# Altium footprint library 常用元件封裝庫(pcb).PCBLIB: 386 footprints (part 25 of 25)
Each footprint in its own frame and in the unit in brackets; x right, y up, seen from the top. Pads: shape width x height; smd on the part's side, far side on the other; paste and mask are expansions set on the pad; w line width, h text height; cw(c..) or ccw(c..) is an arc to the next point about the centre after c.
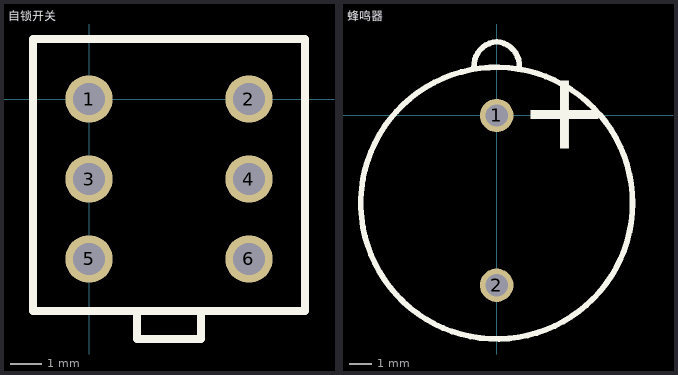
[diagram p24: the footprints below, top view; thin cyan lines are the x and y axes]

## 自锁开关 [mm]
pads (6):
  round 1.5 hole 1.002: 1(0,0) 2(5.08,0) 3(0,-2.54) 4(5.08,-2.54) 5(0,-5.08) 6(5.08,-5.08)
Top Overlay:
  lines w0.254: 1.524,-6.731 1.524,-7.62 3.556,-7.62 3.556,-6.731 ; -1.778,-6.731 -1.778,1.905 6.858,1.905 6.858,-6.731 -1.778,-6.731

## 蜂鸣器 [mm]
pads (2):
  round 1.5 hole 1.002: 1(0,0) 2(0,-7.62)
Top Overlay:
  circle w0.254: c0,-3.937 r6.096
  lines w0.254: -1.016,2.159 cw(c0.064,2.222) 0,3.302 cw(c-0.064,2.222) 1.016,2.159
  text "+" at 1.016,-2.667 h6.1